# Altium footprint library XU-GENARAL PCB .PcbLib: 1176 footprints (part 55 of 75)
Each footprint in its own frame and in the unit in brackets; x right, y up, seen from the top. Pads: shape width x height; smd on the part's side, far side on the other; paste and mask are expansions set on the pad; w line width, h text height; cw(c..) or ccw(c..) is an arc to the next point about the centre after c.
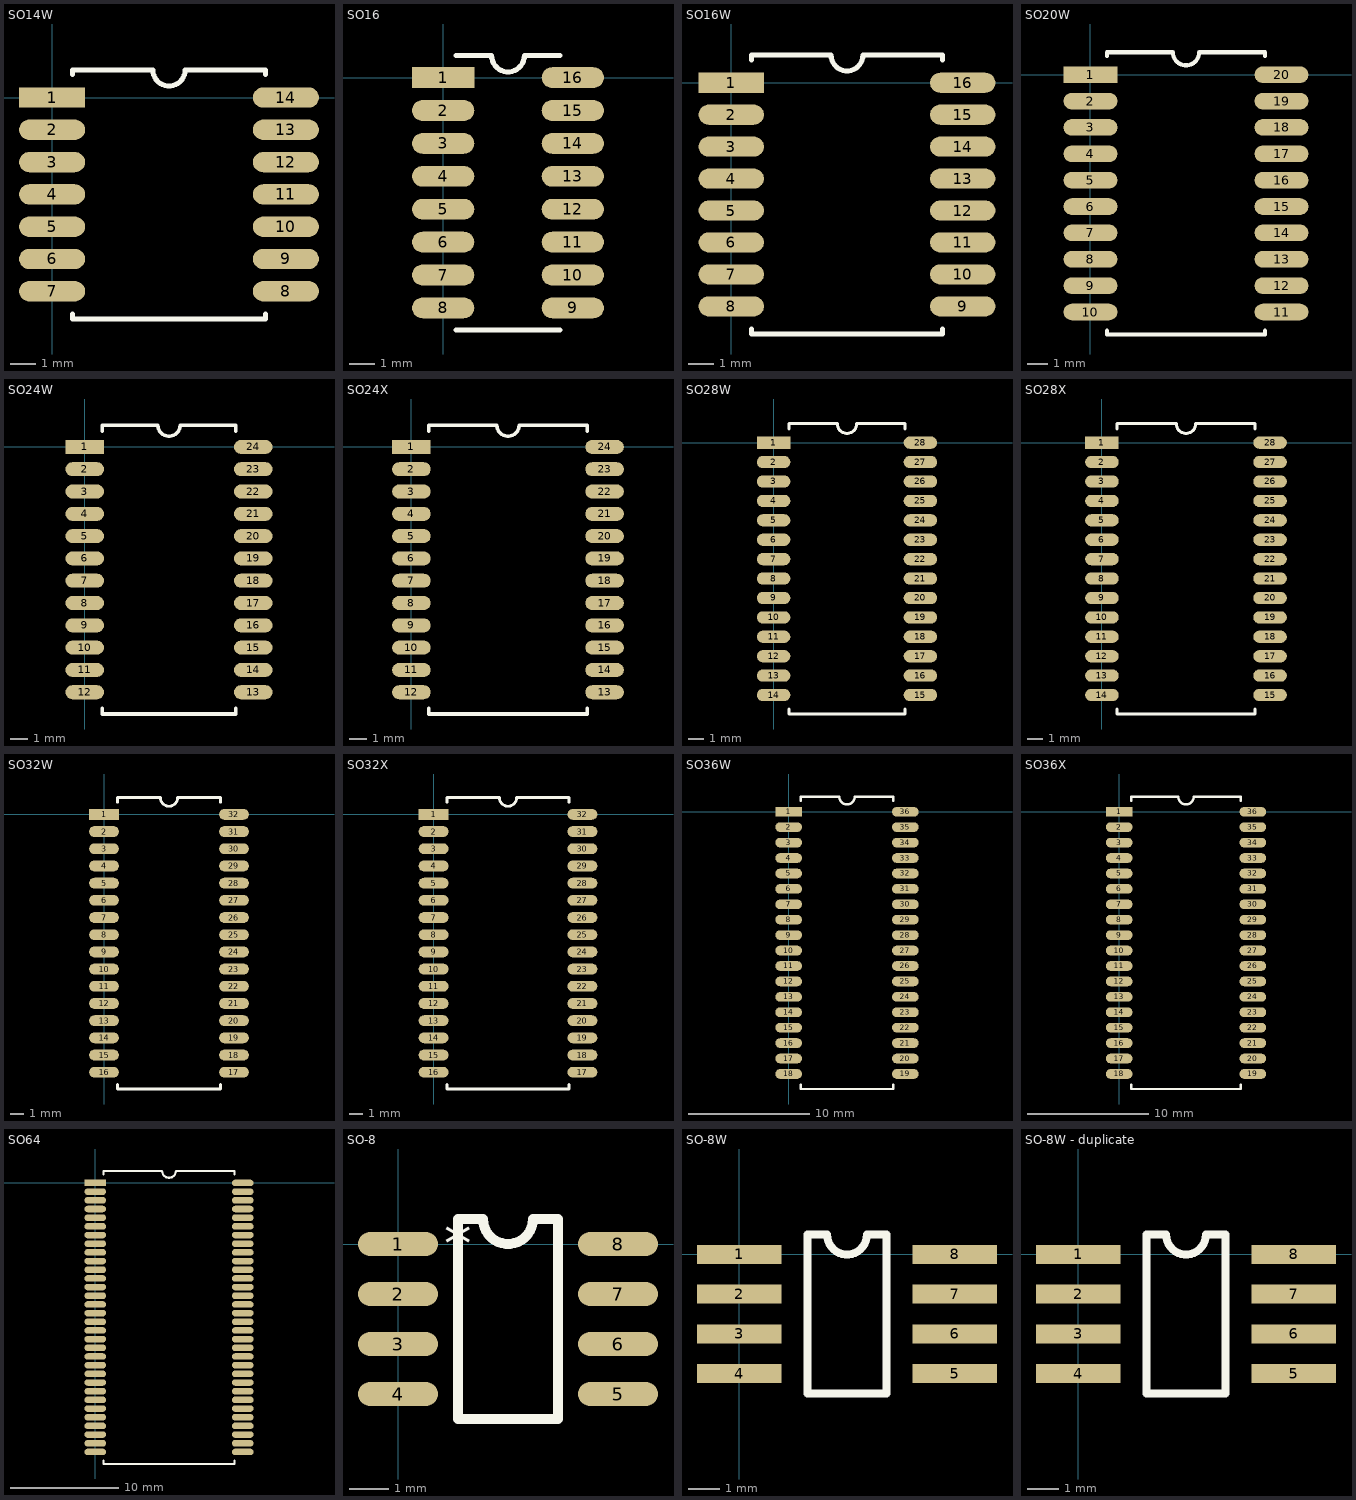
[diagram p54: the footprints below, top view; thin cyan lines are the x and y axes]

## SO14W [mm]
pads (14):
  rect 2.6x0.8 smd: 1(0,0)
  oval 2.6x0.8 smd: 2(0,-1.27) 3(0,-2.54) 4(0,-3.81) 5(0,-5.08) 6(0,-6.35) 7(0,-7.62) 8(9.2,-7.62) 9(9.2,-6.35) 10(9.2,-5.08) 11(9.2,-3.81) 12(9.2,-2.54) 13(9.2,-1.27) 14(9.2,0)
Top Overlay:
  lines w0.2: 0.8,-8.52 0.8,-8.71 8.4,-8.71 8.4,-8.52 ; 0.8,0.9 0.8,1.09 3.965,1.09 ccw(c4.6,1.09) 5.235,1.09 8.4,1.09 8.4,0.9

## SO16 [mm]
pads (16):
  rect 2.4x0.8 smd: 1(0,0)
  oval 2.4x0.8 smd: 2(0,-1.27) 3(0,-2.54) 4(0,-3.81) 5(0,-5.08) 6(0,-6.35) 7(0,-7.62) 8(0,-8.89) 9(5,-8.89) 10(5,-7.62) 11(5,-6.35) 12(5,-5.08) 13(5,-3.81) 14(5,-2.54) 15(5,-1.27) 16(5,0)
Top Overlay:
  lines w0.2: 0.5,-9.745 4.5,-9.745 ; 0.5,0.855 1.865,0.855 ccw(c2.5,0.855) 3.135,0.855 4.5,0.855

## SO16W [mm]
pads (16):
  rect 2.6x0.8 smd: 1(0,0)
  oval 2.6x0.8 smd: 2(0,-1.27) 3(0,-2.54) 4(0,-3.81) 5(0,-5.08) 6(0,-6.35) 7(0,-7.62) 8(0,-8.89) 9(9.2,-8.89) 10(9.2,-7.62) 11(9.2,-6.35) 12(9.2,-5.08) 13(9.2,-3.81) 14(9.2,-2.54) 15(9.2,-1.27) 16(9.2,0)
Top Overlay:
  lines w0.2: 0.8,-9.79 0.8,-9.995 8.4,-9.995 8.4,-9.79 ; 0.8,0.9 0.8,1.105 3.965,1.105 ccw(c4.6,1.105) 5.235,1.105 8.4,1.105 8.4,0.9

## SO20W [mm]
pads (20):
  rect 2.6x0.8 smd: 1(0,0)
  oval 2.6x0.8 smd: 2(0,-1.27) 3(0,-2.54) 4(0,-3.81) 5(0,-5.08) 6(0,-6.35) 7(0,-7.62) 8(0,-8.89) 9(0,-10.16) 10(0,-11.43) 11(9.2,-11.43) 12(9.2,-10.16) 13(9.2,-8.89) 14(9.2,-7.62) 15(9.2,-6.35) 16(9.2,-5.08) 17(9.2,-3.81) 18(9.2,-2.54) 19(9.2,-1.27) 20(9.2,0)
Top Overlay:
  lines w0.2: 0.8,-12.33 0.8,-12.515 8.4,-12.515 8.4,-12.33 ; 0.8,0.9 0.8,1.085 3.965,1.085 ccw(c4.6,1.085) 5.235,1.085 8.4,1.085 8.4,0.9

## SO24W [mm]
pads (24):
  rect 2.2x0.8 smd: 1(0,0)
  oval 2.2x0.8 smd: 2(0,-1.27) 3(0,-2.54) 4(0,-3.81) 5(0,-5.08) 6(0,-6.35) 7(0,-7.62) 8(0,-8.89) 9(0,-10.16) 10(0,-11.43) 11(0,-12.7) 12(0,-13.97) 13(9.6,-13.97) 14(9.6,-12.7) 15(9.6,-11.43) 16(9.6,-10.16) 17(9.6,-8.89) 18(9.6,-7.62) 19(9.6,-6.35) 20(9.6,-5.08) 21(9.6,-3.81) 22(9.6,-2.54) 23(9.6,-1.27) 24(9.6,0)
Top Overlay:
  lines w0.2: 1,-14.87 1,-15.21 8.6,-15.21 8.6,-14.87 ; 1,0.9 1,1.24 4.165,1.24 ccw(c4.8,1.24) 5.435,1.24 8.6,1.24 8.6,0.9

## SO24X [mm]
pads (24):
  rect 2.2x0.8 smd: 1(0,0)
  oval 2.2x0.8 smd: 2(0,-1.27) 3(0,-2.54) 4(0,-3.81) 5(0,-5.08) 6(0,-6.35) 7(0,-7.62) 8(0,-8.89) 9(0,-10.16) 10(0,-11.43) 11(0,-12.7) 12(0,-13.97) 13(11,-13.97) 14(11,-12.7) 15(11,-11.43) 16(11,-10.16) 17(11,-8.89) 18(11,-7.62) 19(11,-6.35) 20(11,-5.08) 21(11,-3.81) 22(11,-2.54) 23(11,-1.27) 24(11,0)
Top Overlay:
  lines w0.2: 0.99,-14.87 0.99,-15.21 10.01,-15.21 10.01,-14.87 ; 0.99,0.9 0.99,1.24 4.865,1.24 ccw(c5.5,1.24) 6.135,1.24 10.01,1.24 10.01,0.9

## SO28W [mm]
pads (28):
  rect 2.2x0.8 smd: 1(0,0)
  oval 2.2x0.8 smd: 2(0,-1.27) 3(0,-2.54) 4(0,-3.81) 5(0,-5.08) 6(0,-6.35) 7(0,-7.62) 8(0,-8.89) 9(0,-10.16) 10(0,-11.43) 11(0,-12.7) 12(0,-13.97) 13(0,-15.24) 14(0,-16.51) 15(9.6,-16.51) 16(9.6,-15.24) 17(9.6,-13.97) 18(9.6,-12.7) 19(9.6,-11.43) 20(9.6,-10.16) 21(9.6,-8.89) 22(9.6,-7.62) 23(9.6,-6.35) 24(9.6,-5.08) 25(9.6,-3.81) 26(9.6,-2.54) 27(9.6,-1.27) 28(9.6,0)
Top Overlay:
  lines w0.2: 1,-17.41 1,-17.75 8.6,-17.75 8.6,-17.41 ; 1,0.9 1,1.24 4.165,1.24 ccw(c4.8,1.24) 5.435,1.24 8.6,1.24 8.6,0.9

## SO28X [mm]
pads (28):
  rect 2.2x0.8 smd: 1(0,0)
  oval 2.2x0.8 smd: 2(0,-1.27) 3(0,-2.54) 4(0,-3.81) 5(0,-5.08) 6(0,-6.35) 7(0,-7.62) 8(0,-8.89) 9(0,-10.16) 10(0,-11.43) 11(0,-12.7) 12(0,-13.97) 13(0,-15.24) 14(0,-16.51) 15(11,-16.51) 16(11,-15.24) 17(11,-13.97) 18(11,-12.7) 19(11,-11.43) 20(11,-10.16) 21(11,-8.89) 22(11,-7.62) 23(11,-6.35) 24(11,-5.08) 25(11,-3.81) 26(11,-2.54) 27(11,-1.27) 28(11,0)
Top Overlay:
  lines w0.2: 0.99,-17.41 0.99,-17.75 10.01,-17.75 10.01,-17.41 ; 0.99,0.9 0.99,1.24 4.865,1.24 ccw(c5.5,1.24) 6.135,1.24 10.01,1.24 10.01,0.9

## SO32W [mm]
pads (32):
  rect 2.2x0.8 smd: 1(0,0)
  oval 2.2x0.8 smd: 2(0,-1.27) 3(0,-2.54) 4(0,-3.81) 5(0,-5.08) 6(0,-6.35) 7(0,-7.62) 8(0,-8.89) 9(0,-10.16) 10(0,-11.43) 11(0,-12.7) 12(0,-13.97) 13(0,-15.24) 14(0,-16.51) 15(0,-17.78) 16(0,-19.05) 17(9.6,-19.05) 18(9.6,-17.78) 19(9.6,-16.51) 20(9.6,-15.24) 21(9.6,-13.97) 22(9.6,-12.7) 23(9.6,-11.43) 24(9.6,-10.16) 25(9.6,-8.89) 26(9.6,-7.62) 27(9.6,-6.35) 28(9.6,-5.08) 29(9.6,-3.81) 30(9.6,-2.54) 31(9.6,-1.27) 32(9.6,0)
Top Overlay:
  lines w0.2: 1,-19.95 1,-20.29 8.6,-20.29 8.6,-19.95 ; 1,0.9 1,1.24 4.165,1.24 ccw(c4.8,1.24) 5.435,1.24 8.6,1.24 8.6,0.9

## SO32X [mm]
pads (32):
  rect 2.2x0.8 smd: 1(0,0)
  oval 2.2x0.8 smd: 2(0,-1.27) 3(0,-2.54) 4(0,-3.81) 5(0,-5.08) 6(0,-6.35) 7(0,-7.62) 8(0,-8.89) 9(0,-10.16) 10(0,-11.43) 11(0,-12.7) 12(0,-13.97) 13(0,-15.24) 14(0,-16.51) 15(0,-17.78) 16(0,-19.05) 17(11,-19.05) 18(11,-17.78) 19(11,-16.51) 20(11,-15.24) 21(11,-13.97) 22(11,-12.7) 23(11,-11.43) 24(11,-10.16) 25(11,-8.89) 26(11,-7.62) 27(11,-6.35) 28(11,-5.08) 29(11,-3.81) 30(11,-2.54) 31(11,-1.27) 32(11,0)
Top Overlay:
  lines w0.2: 0.99,-19.95 0.99,-20.29 10.01,-20.29 10.01,-19.95 ; 0.99,0.9 0.99,1.24 4.865,1.24 ccw(c5.5,1.24) 6.135,1.24 10.01,1.24 10.01,0.9

## SO36W [mm]
pads (36):
  rect 2.2x0.8 smd: 1(0,0)
  oval 2.2x0.8 smd: 2(0,-1.27) 3(0,-2.54) 4(0,-3.81) 5(0,-5.08) 6(0,-6.35) 7(0,-7.62) 8(0,-8.89) 9(0,-10.16) 10(0,-11.43) 11(0,-12.7) 12(0,-13.97) 13(0,-15.24) 14(0,-16.51) 15(0,-17.78) 16(0,-19.05) 17(0,-20.32) 18(0,-21.59) 19(9.6,-21.59) 20(9.6,-20.32) 21(9.6,-19.05) 22(9.6,-17.78) 23(9.6,-16.51) 24(9.6,-15.24) 25(9.6,-13.97) 26(9.6,-12.7) 27(9.6,-11.43) 28(9.6,-10.16) 29(9.6,-8.89) 30(9.6,-7.62) 31(9.6,-6.35) 32(9.6,-5.08) 33(9.6,-3.81) 34(9.6,-2.54) 35(9.6,-1.27) 36(9.6,0)
Top Overlay:
  lines w0.2: 1,-22.49 1,-22.83 8.6,-22.83 8.6,-22.49 ; 1,0.9 1,1.24 4.165,1.24 ccw(c4.8,1.24) 5.435,1.24 8.6,1.24 8.6,0.9

## SO36X [mm]
pads (36):
  rect 2.2x0.8 smd: 1(0,0)
  oval 2.2x0.8 smd: 2(0,-1.27) 3(0,-2.54) 4(0,-3.81) 5(0,-5.08) 6(0,-6.35) 7(0,-7.62) 8(0,-8.89) 9(0,-10.16) 10(0,-11.43) 11(0,-12.7) 12(0,-13.97) 13(0,-15.24) 14(0,-16.51) 15(0,-17.78) 16(0,-19.05) 17(0,-20.32) 18(0,-21.59) 19(11,-21.59) 20(11,-20.32) 21(11,-19.05) 22(11,-17.78) 23(11,-16.51) 24(11,-15.24) 25(11,-13.97) 26(11,-12.7) 27(11,-11.43) 28(11,-10.16) 29(11,-8.89) 30(11,-7.62) 31(11,-6.35) 32(11,-5.08) 33(11,-3.81) 34(11,-2.54) 35(11,-1.27) 36(11,0)
Top Overlay:
  lines w0.2: 0.99,-22.49 0.99,-22.83 10.01,-22.83 10.01,-22.49 ; 0.99,0.9 0.99,1.24 4.865,1.24 ccw(c5.5,1.24) 6.135,1.24 10.01,1.24 10.01,0.9

## SO64 [mm]
pads (64):
  rect 2x0.6 smd: 1(0,0)
  oval 2x0.6 smd: 2(0,-0.8) 3(0,-1.6) 4(0,-2.4) 5(0,-3.2) 6(0,-4) 7(0,-4.8) 8(0,-5.6) 9(0,-6.4) 10(0,-7.2) 11(0,-8) 12(0,-8.8) 13(0,-9.6) 14(0,-10.4) 15(0,-11.2) 16(0,-12) 17(0,-12.8) 18(0,-13.6) 19(0,-14.4) 20(0,-15.2) 21(0,-16) 22(0,-16.8) 23(0,-17.6) 24(0,-18.4) 25(0,-19.2) 26(0,-20) 27(0,-20.8) 28(0,-21.6) 29(0,-22.4) 30(0,-23.2) 31(0,-24) 32(0,-24.8) 33(13.6,-24.8) 34(13.6,-24) 35(13.6,-23.2) 36(13.6,-22.4) 37(13.6,-21.6) 38(13.6,-20.8) 39(13.6,-20) 40(13.6,-19.2) 41(13.6,-18.4) 42(13.6,-17.6) 43(13.6,-16.8) 44(13.6,-16) 45(13.6,-15.2) 46(13.6,-14.4) 47(13.6,-13.6) 48(13.6,-12.8) 49(13.6,-12) 50(13.6,-11.2) 51(13.6,-10.4) 52(13.6,-9.6) 53(13.6,-8.8) 54(13.6,-8) 55(13.6,-7.2) 56(13.6,-6.4) 57(13.6,-5.6) 58(13.6,-4.8) 59(13.6,-4) 60(13.6,-3.2) 61(13.6,-2.4) 62(13.6,-1.6) 63(13.6,-0.8) 64(13.6,0)
Top Overlay:
  lines w0.2: 0.75,-25.6 0.75,-25.915 12.85,-25.915 12.85,-25.6 ; 0.75,0.8 0.75,1.115 6.165,1.115 ccw(c6.8,1.115) 7.435,1.115 12.85,1.115 12.85,0.8

## SO-8 [mil]
pads (8):
  oval 80x24 smd: 1(0,0) 2(0,-50) 3(0,-100) 4(0,-150) 5(220,-150) 6(220,-100) 7(220,-50) 8(220,0)
Top Overlay:
  lines w10: 60,-175 60,25 85,25 ccw(c110,25) 135,25 160,25 160,-175 60,-175
  text "*" at 46,-19 h40

## SO-8W [mil]
pads (8):
  rect 106.3x24 smd: 1(0,0) 2(0,-50) 3(0,-100) 4(0,-150) 5(271.81,-150) 6(271.81,-100) 7(271.81,-50) 8(271.81,0)
Top Overlay:
  lines w10: 85.91,-175 85.91,25 110.91,25 ccw(c135.91,25) 160.91,25 185.91,25 185.91,-175 85.91,-175

## SO-8W - duplicate [mil]
pads (8):
  rect 106.3x24 smd: 1(0,0) 2(0,-50) 3(0,-100) 4(0,-150) 5(271.81,-150) 6(271.81,-100) 7(271.81,-50) 8(271.81,0)
Top Overlay:
  lines w10: 85.91,-175 85.91,25 110.91,25 ccw(c135.91,25) 160.91,25 185.91,25 185.91,-175 85.91,-175